# Altium schematic symbol library AD_Lib.SchLib: 1239 symbols (part 9 of 9)
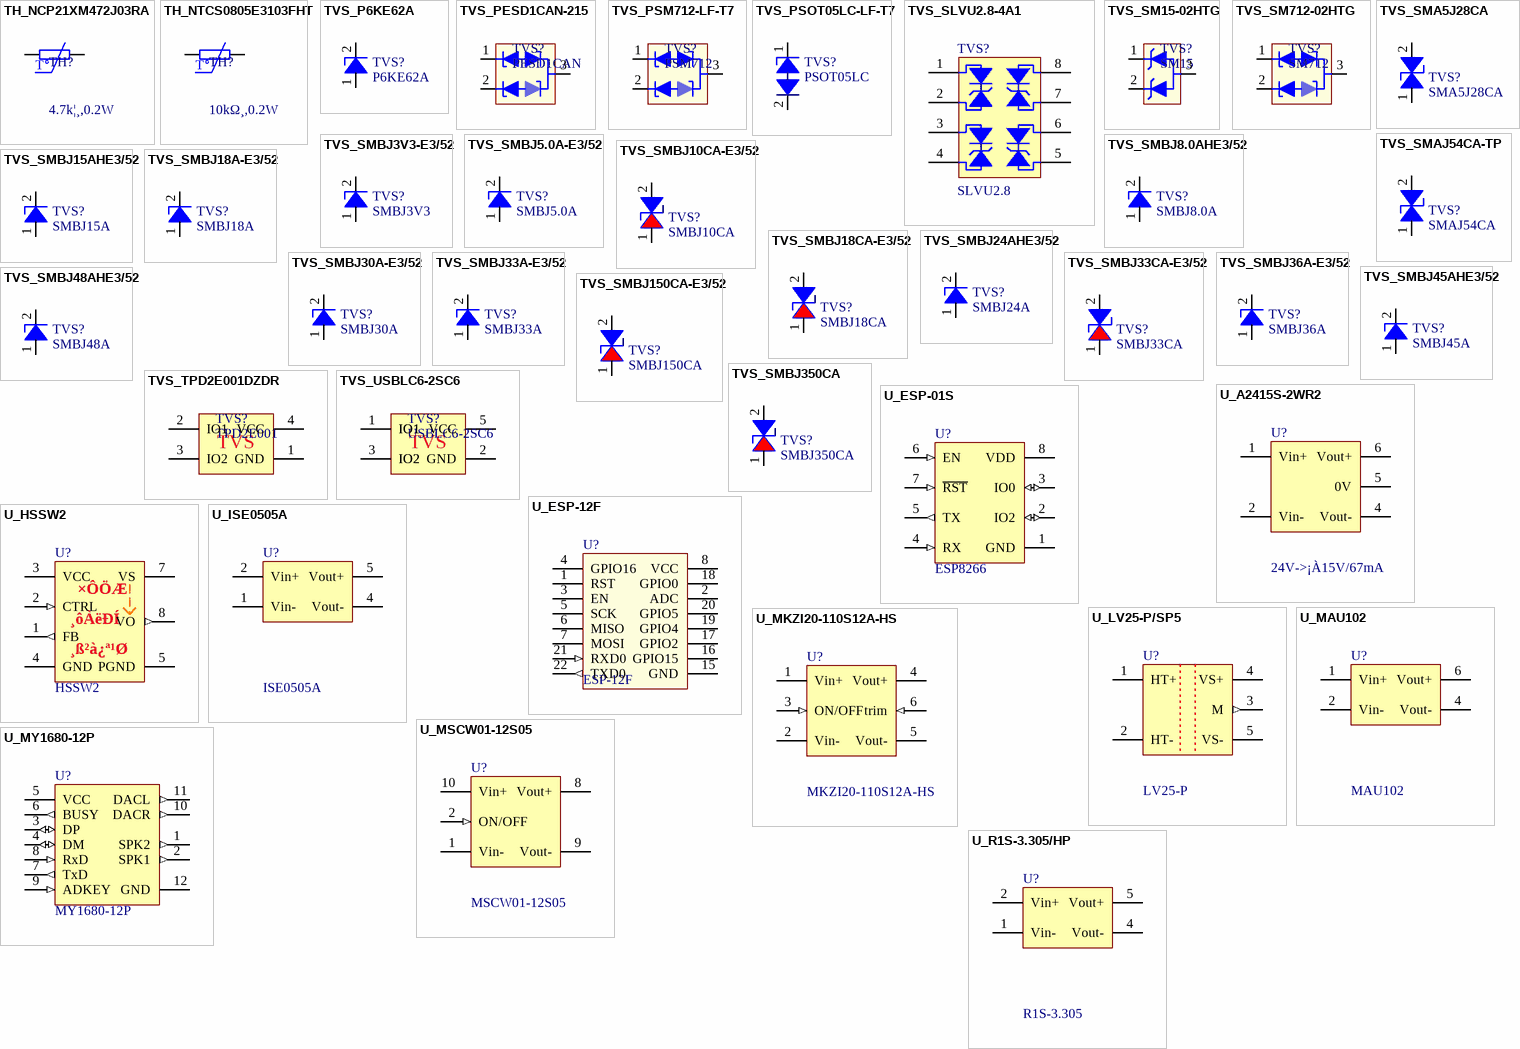
[diagram p50: symbols TH_NCP21XM472J03RA to U_R1S-3.305/HP]

## U_HSSW2
designator U?, comment HSSW2
×ÔÖÆ; ¸ß²à¿ª¹Ø; ¸ôÀë&·´À¡; Manufacturer: GRC; Quality: -40~66¡æ; Value: 300V/2A; pro-environment: RoHS; other: Vin=40~160V;Vout=12V/1.67A;20W;´øÉ¢ÈÈÆ¬; PadsNum: 9; SN: SN; Category: Ä£¿éµçÂ·; OPN: HSSW2; Part: HSSW2; QTY: -; Price: ?; OPN_JLC: GRC; SN_JLC: SN_JLC; Price_JLC: 0
footprint U_HSSW2 (×ÔÖÆ¼þ£¬¸ß²à¿ª¹Ø£¬¸ôÀë+·´À¡)
pins: 1 FB (out), 2 CTRL (in), 3 VCC (power), 4 GND (power), 5 PGND (power), 7 VS (power), 8 VO (out), 11 RV- (power), 12 RV+
text: ×ÔÖÆ; ¸ôÀëÐÍ; ¸ß²à¿ª¹Ø

## U_ISE0505A
designator U?, comment ISE0505A
DC/DC,Vin=5V;Vout=5V/0.2A; Manufacturer: XP; Quality: -40~105°C; pro-environment: RoHS; PadsNum: 0; Value: 5V/0.2A; SN: SN; other: Vin=5V;Vout=5V/0.2A; Category: Isolated DC/DC Converters; OPN: ISE0505A; Part: ISE0505A; QTY: 40; Price: ?; Price_JLC: 0
footprint U_XP_ISE0505A (DC/DC XP)
pins: 1 Vin- (power), 2 Vin+ (power), 4 Vout- (power), 5 Vout+ (power)

## U_LV25-P/SP5
designator U?, comment LV25-P
Voltage Sensor;Vin=500V;Iin=10mA;Gain=2.5; Manufacturer: LEM; Quality: -40~85¡æ; Value: G=2500:1000; pro-environment: RoHS; OPN: LV25-P/SP5; PadsNum: 0; SN: SN; other: Vin=500V;Iin=10mA;Gain=2.5; Category: Ä£¿éµçÂ·; Part: LV25-P; QTY: 1; Price: ?; OPN_JLC: OPN_JLC; SN_JLC: SN_JLC; Price_JLC: 0
footprint LV25-P (Footprint not found)
pins: 1 HT+ (power), 2 HT- (power), 3 M (out), 4 VS+ (power), 5 VS- (power)

## U_MAU102
designator U?, comment MAU102
DC/DC,Vin=5V;Vout=5V/0.2A; Manufacturer: MINMAX; Quality: -40~100¡æ; pro-environment: RoHS; PadsNum: 0; Value: 5V/0.2A; SN: SN; other: Vin=5V;Vout=5V/0.2A; Category: Ä£¿éµçÂ·; OPN: MAU102; Part: MAU102; QTY: 10; Price: 35.5329; OPN_JLC: OPN_JLC; SN_JLC: SN_JLC; Price_JLC: 0
footprint TRACO_SIP6 (Footprint not found)
pins: 1 Vin+ (power), 2 Vin- (power), 4 Vout- (power), 6 Vout+ (power)

## U_MKZI20-110S12A-HS
designator U?, comment MKZI20-110S12A-HS
DC/DC,Vin=40~160V;Vout=12V/1.67A; Manufacturer: MINMAX; Quality: -40~66¡æ; pro-environment: RoHS; SN: 03.4.11.11.99201201S; other: Vin=40~160V;Vout=12V/1.67A;20W;´øÉ¢ÈÈÆ¬; PadsNum: 0; Value: 12V/1.67A; Category: Ä£¿éµçÂ·; OPN: MKZI20-110S12A-HS; Part: MKZI20-110S12A-HS; QTY: -; Price: ?; OPN_JLC: OPN_JLC; SN_JLC: SN_JLC; Price_JLC: 0
footprint MKZI20A (MINMAX¸ôÀëµçÔ´£¬20W£¬´ø"A"ºó×º)
pins: 1 Vin+ (power), 2 Vin- (power), 3 ON/OFF (in), 4 Vout+ (power), 5 Vout- (power), 6 trim (in)

## U_MSCW01-12S05
designator U?, comment MSCW01-12S05
DC/DC,Vin=12V£¬Vout=5V/0.2A, ÎÈÑ¹; Manufacturer: MINMAX; Quality: -40~85¡æ; pro-environment: RoHS; other: Vin=9~18V;Vout=5V/0.2A; PadsNum: 0; Value: 5V/0.2A; SN: SN; Category: Ä£¿éµçÂ·; OPN: MSCW01-12S05; Part: MSCW01-12S05; QTY: 39; Price: ?; OPN_JLC: OPN_JLC; SN_JLC: SN_JLC; Price_JLC: 0
footprint MINMAX_MSCW01 (DC/DC¸ôÀëµçÔ´Ä£¿é£»MSCW01Ö®1WÏµÁÐ£»MINMAX)
pins: 1 Vin- (power), 2 ON/OFF (in), 8 Vout+ (power), 9 Vout- (power), 10 Vin+ (power)

## U_MY1680-12P
designator U?, comment MY1680-12P
Voice;UART;3W; Manufacturer: ÉîÛÚÂõÓÅ; Quality: -40~85¡æ; Value: UART<->Voice; pro-environment: RoHS; other: 3W Speaker; 16M Flash; PadsNum: 0; SN: SN; Category: Ä£¿éµçÂ·; OPN: MY1680-12P; Part: MY1680-12P; QTY: 1; Price: 11.5; OPN_JLC: OPN_JLC; SN_JLC: SN_JLC; Price_JLC: 0
footprint MY1680-12P (ÉîÛÚÂõÓÅÓïÒôÄ£¿é)
pins: 1 SPK2 (out), 2 SPK1 (out), 3 DP (io), 4 DM (io), 5 VCC (power), 6 BUSY (out), 7 TxD (out), 8 RxD (in), 9 ADKEY (in), 10 DACR (out), 11 DACL (out), 12 GND (power)

## U_R1S-3.305/HP
designator U?, comment R1S-3.305
DC/DC,Vin=3.3V;Vout=5V/0.2A; Manufacturer: RECOM; Quality: -40~100¡æ; pro-environment: RoHS; SN: 03.4.11.11.85330501S; OPN: R1S-3.305/HP; PadsNum: 0; Value: 5V/0.2A; other: Vin=3.3V;Vout=5V/0.2A; Category: Ä£¿éµçÂ·; Part: R1S-3.305; QTY: 40; Price: ?; OPN_JLC: OPN_JLC; SN_JLC: SN_JLC; Price_JLC: 0
footprint U_RECOM_R1S5P (DC/DC¸ôÀëµçÔ´Ä£¿é£»R1S/R1DÖ®5pin ÏµÁÐ£»RECOM)
pins: 1 Vin- (power), 2 Vin+ (power), 4 Vout- (power), 5 Vout+ (power)

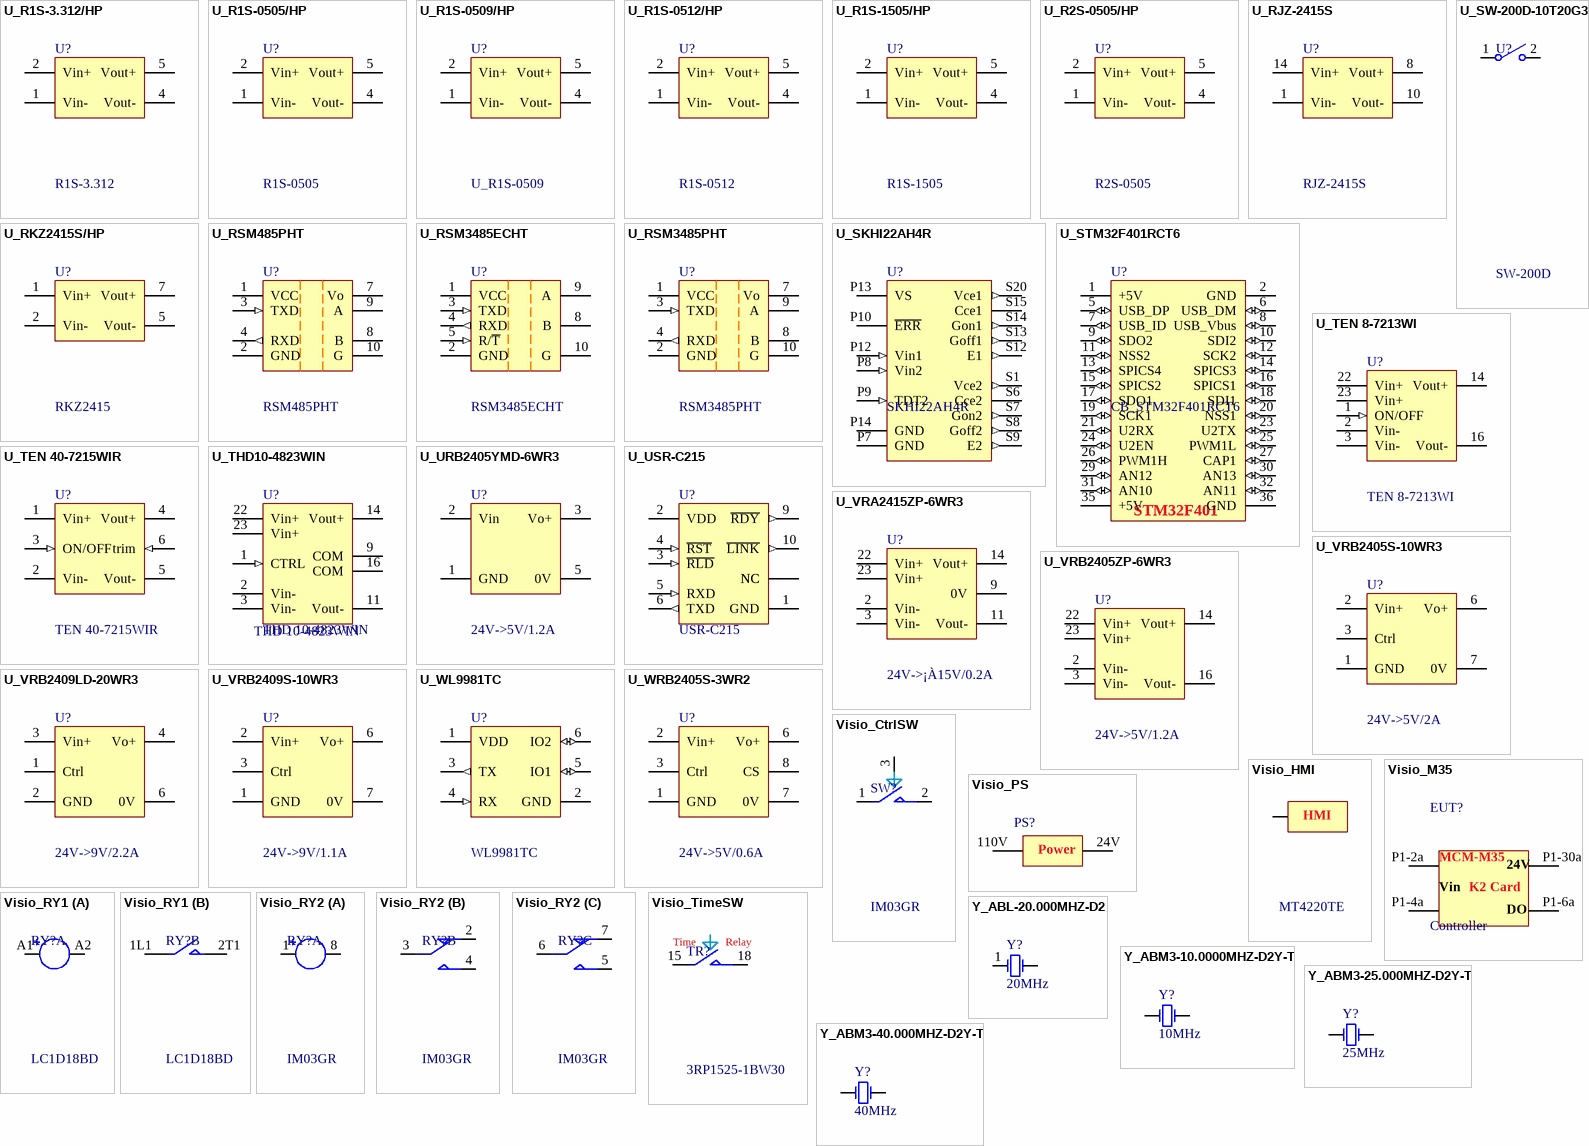
[diagram p40: symbols U_R1S-3.312/HP to Y_ABM3-40.000MHZ-D2Y-T]

## U_R1S-3.312/HP
designator U?, comment R1S-3.312
DC/DC,Vin=3.3V;Vout=12V/0.2A; Manufacturer: RECOM; Quality: -40~100¡æ; Value: 12V/84mA; pro-environment: RoHS; other: Vin=3.3V;Vout=12V/84mA; OPN: R1S-3.312/HP; PadsNum: 0; SN: SN; Category: Ä£¿éµçÂ·; Part: R1S-3.312; QTY: 40; Price: ?; OPN_JLC: OPN_JLC; SN_JLC: SN_JLC; Price_JLC: 0
footprint U_RECOM_R1S5P (DC/DC¸ôÀëµçÔ´Ä£¿é£»R1S/R1DÖ®5pin ÏµÁÐ£»RECOM)
pins: 1 Vin- (power), 2 Vin+ (power), 4 Vout- (power), 5 Vout+ (power)

## U_R1S-0505/HP
designator U?, comment R1S-0505
DC/DC,Vin=5V;Vout=5V/0.2A; Manufacturer: RECOM; Quality: -40~100¡æ; pro-environment: RoHS; OPN: R1S-0505/HP; PadsNum: 0; Value: 5V/0.2A; SN: SN; other: Vin=5V;Vout=5V/0.2A; Category: Ä£¿éµçÂ·; Part: R1S-0505; QTY: 40; Price: ?; OPN_JLC: OPN_JLC; SN_JLC: SN_JLC; Price_JLC: 0
footprint U_RECOM_R1S5P (DC/DC¸ôÀëµçÔ´Ä£¿é£»R1S/R1DÖ®5pin ÏµÁÐ£»RECOM)
pins: 1 Vin- (power), 2 Vin+ (power), 4 Vout- (power), 5 Vout+ (power)

## U_R1S-0509/HP
designator U?, comment U_R1S-0509
DC/DC,Vin=5V;Vout=9V/0.11A; Manufacturer: RECOM; Quality: -40~100¡æ; pro-environment: RoHS; SN: 03.4.11.13.99050901S; OPN: R1S-0509/HP; PadsNum: 0; Value: 9V/0.11A; other: Vin=5V;Vout=9V/0.11A; Category: Ä£¿éµçÂ·; Part: U_R1S-0509; QTY: 40; Price: ?; OPN_JLC: OPN_JLC; SN_JLC: SN_JLC; Price_JLC: 0
footprint U_RECOM_R1S5P (DC/DC¸ôÀëµçÔ´Ä£¿é£»R1S/R1DÖ®5pin ÏµÁÐ£»RECOM)
pins: 1 Vin- (power), 2 Vin+ (power), 4 Vout- (power), 5 Vout+ (power)

## U_R1S-0512/HP
designator U?, comment R1S-0512
DC/DC,Vin=5V;Vout=12V/0.2A; Manufacturer: RECOM; Quality: -40~100¡æ; Value: 12V/84mA; pro-environment: RoHS; SN: 03.4.11.11.85051201S; other: Vin=5V;Vout=12V/84mA; OPN: R1S-0512/HP; PadsNum: 0; Category: Ä£¿éµçÂ·; Part: R1S-0512; QTY: 40; Price: ?; OPN_JLC: OPN_JLC; SN_JLC: SN_JLC; Price_JLC: 0
footprint U_RECOM_R1S5P (DC/DC¸ôÀëµçÔ´Ä£¿é£»R1S/R1DÖ®5pin ÏµÁÐ£»RECOM)
pins: 1 Vin- (power), 2 Vin+ (power), 4 Vout- (power), 5 Vout+ (power)

## U_R1S-1505/HP
designator U?, comment R1S-1505
DC/DC,Vin=15V;Vout=5V/0.2A; Manufacturer: RECOM; Quality: -40~100¡æ; pro-environment: RoHS; SN: 03.4.11.11.85150501S; OPN: R1S-1505/HP; PadsNum: 0; Value: 5V/0.2A; other: Vin=15V;Vout=5V/0.2A; Category: Ä£¿éµçÂ·; Part: R1S-1505; QTY: 40; Price: 58.2309; OPN_JLC: OPN_JLC; SN_JLC: SN_JLC; Price_JLC: 0
footprint U_RECOM_R1S5P (DC/DC¸ôÀëµçÔ´Ä£¿é£»R1S/R1DÖ®5pin ÏµÁÐ£»RECOM)
pins: 1 Vin- (power), 2 Vin+ (power), 4 Vout- (power), 5 Vout+ (power)

## U_R2S-0505/HP
designator U?, comment R2S-0505
DC/DC,Vin=5V;Vout=5V/0.4A; Manufacturer: RECOM; Quality: -40~100¡æ; pro-environment: RoHS; SN: 03.4.11.13.99050502S; OPN: R2S-0505/HP; PadsNum: 0; Value: 5V/0.4A; other: Vin=5V;Vout=5V/0.4A; Category: Ä£¿éµçÂ·; Part: R2S-0505; QTY: 39; Price: 87.633; OPN_JLC: OPN_JLC; SN_JLC: SN_JLC; Price_JLC: 0
footprint U_RECOM_R2S5P (RECOMÖ®R2SÏµÁÐDC/DC£¬5Pin)
pins: 1 Vin- (power), 2 Vin+ (power), 4 Vout- (power), 5 Vout+ (power)

## U_RJZ-2415S
designator U?, comment RJZ-2415S
DC/DC,Vin=24V;Vout=15V/0.133A; Manufacturer: RECOM; Quality: -40~100¡æ; pro-environment: RoHS; SN: 03.4.11.11.11241501S; PadsNum: 0; Value: 15V/0.133A; other: Vin=24V;Vout=15V/0.133A; Category: Ä£¿éµçÂ·; OPN: RJZ-2415S; Part: RJZ-2415S; QTY: 24; Price: 73.5696; OPN_JLC: OPN_JLC; SN_JLC: SN_JLC; Price_JLC: 0
footprint U_RECOM_RJZ (RECOMÖ®DC/DCÄ£¿é)
pins: 1 Vin- (power), 8 Vout+ (power), 10 Vout- (power), 14 Vin+ (power)

## U_RKZ2415S/HP
designator U?, comment RKZ2415
DC/DC,Vin=24V;Vout=15V/132mA; Manufacturer: RECOM; Quality: -40~85¡æ; pro-environment: RoHS; OPN: RKZ2415S/HP; PadsNum: 0; Value: 15V/132mA; SN: SN; other: Vin=24V;Vout=15V/132mA; Category: Ä£¿éµçÂ·; Part: RKZ2415; QTY: 25; Price: 77.8518; OPN_JLC: OPN_JLC; SN_JLC: SN_JLC; Price_JLC: 0
footprint U_RECOM_RKZ (RECOMÖ®RKZÏµÁÐDC/DC)
pins: 1 Vin+ (power), 2 Vin- (power), 5 Vout- (power), 7 Vout+ (power)

## U_RSM485PHT
designator U?, comment RSM485PHT
RS485; 4.75~5.25V; 500kbps; ×Ô¶¯ÊÕ·¢; Manufacturer: ZLG; Quality: -40~85¡æ; Value: 5V,500kps; pro-environment: RoHS; other: 4.75~5.25V,500kbps; OPN: RSM3485PHT; PadsNum: 0; SN: SN; Category: Ä£¿éµçÂ·; Part: RSM485PHT; QTY: 30; Price: -; OPN_JLC: RSM3485PHT; SN_JLC: C882108; Price_JLC: 17.26
footprint U_RSM485 (ZLGÖ®¸ôÀëRS485ÊÕ·¢Æ÷£¬RSM(3)485E(PC)HT)
pins: 1 VCC (power), 2 GND (power), 3 TXD (in), 4 RXD (out), 7 Vo (power), 8 B, 9 A, 10 G (power)

## U_RSM3485ECHT
designator U?, comment RSM3485ECHT
RS485; 3.17~3.45V; 500kbps; Manufacturer: ZLG; Quality: -40~85¡æ; Value: 3.3V,500kps; pro-environment: RoHS; other: 3.17~3.45V,500kbps; PadsNum: 0; SN: SN; Category: Ä£¿éµçÂ·; OPN: RSM3485ECHT; Part: RSM3485ECHT; QTY: 15; Price: -; OPN_JLC: RSM3485ECHT; SN_JLC: C52032; Price_JLC: 43.98
footprint U_RSM485 (ZLGÖ®¸ôÀëRS485ÊÕ·¢Æ÷£¬RSM(3)485E(PC)HT)
pins: 1 VCC (power), 2 GND (power), 3 TXD (in), 4 RXD (out), 5 R/~{T} (in), 8 B, 9 A, 10 G (power)

## U_RSM3485PHT
designator U?, comment RSM3485PHT
RS485; 3.17~3.45V; 500kbps; ×Ô¶¯ÊÕ·¢; Manufacturer: ZLG; Quality: -40~85¡æ; Value: 3.3V,500kps; pro-environment: RoHS; other: 3.17~3.45V,500kbps; PadsNum: 0; SN: SN; Category: Ä£¿éµçÂ·; OPN: RSM3485PHT; Part: RSM3485PHT; QTY: 30; Price: -; OPN_JLC: RSM3485PHT; SN_JLC: C882109; Price_JLC: 17.26
footprint U_RSM485 (ZLGÖ®¸ôÀëRS485ÊÕ·¢Æ÷£¬RSM(3)485E(PC)HT)
pins: 1 VCC (power), 2 GND (power), 3 TXD (in), 4 RXD (out), 7 Vo (power), 8 B, 9 A, 10 G (power)

## U_SKHI22AH4R
designator U?, comment SKHI22AH4R
IGBTÇý¶¯; Vin=15V; 1200V/8MHz; °ëÇÅ; Manufacturer: SEMIKRON; Quality: -40~85¡æ; pro-environment: RoHS; other: Vin=15V;Vout=1200V; °ëÇÅ; PadsNum: 0; Value: 1200V/8MHz; SN: SN; Category: Ä£¿éµçÂ·; OPN: SKHI22AH4R; Part: SKHI22AH4R; QTY: 10; Price: 1000; OPN_JLC: OPN_JLC; SN_JLC: SN_JLC; Price_JLC: 0
footprint U_SKHI22A (Footprint not found)
pins: P7 GND (power), P8 Vin2 (in), P9 TDT2 (in), P10 ~{ERR} (oc), P12 Vin1 (in), P13 VS (power), P14 GND (power), S1 Vce2 (out), S6 Cce2, S7 Gon2 (out), S8 Goff2 (out), S9 E2 (out), S12 E1 (out), S13 Goff1 (out), S14 Gon1 (out), S15 Cce1, S20 Vce1 (out)

## U_STM32F401RCT6
designator U?, comment CB_STM32F401RCT6
CoreBoard; STM32F401RCT6;; Manufacturer: GRC; Quality: -40~85¡æ; pro-environment: RoHS; PadsNum: 0; Value: STM32F401RCT6; SN: SN; other: CoreBoard; STM32F401RCT6;; Category: Ä£¿éµçÂ·; OPN: CB_STM32F401RCT6; Part: CB_STM32F401RCT6; QTY: 1; Price: 0; OPN_JLC: CB_STM32F401RCT6; SN_JLC: SN_JLC; Price_JLC: 0
footprint J_HDR2*18 (Connector; Header; 2*18)
pins: 1 +5V (power), 2 GND (power), 5 USB_DP (io), 6 USB_DM (io), 7 USB_ID (io), 8 USB_Vbus (io), 9 SDO2 (io), 10 SDI2 (io), 11 NSS2 (io), 12 SCK2 (io), 13 SPICS4 (io), 14 SPICS3 (io), 15 SPICS2 (io), 16 SPICS1 (io), 17 SDO1 (io), 18 SDI1 (io), 19 SCK1 (io), 20 NSS1 (io), 21 U2RX (io), 23 U2TX (io), 24 U2EN (io), 25 PWM1L (io), 26 PWM1H (io), 27 CAP1 (io), 29 AN12 (io), 30 AN13 (io), 31 AN10 (io), 32 AN11 (io), 35 +5V (power), 36 GND (power)
text: STM32F401

## U_SW-200D-10T20G3
designator U?, comment SW-200D
´«¸ÐÆ÷; 12V/20mA; 2ms; Õð¶¯; Manufacturer: XKB; pro-environment: RoHS; Quality: -40~85¡æ; Value: 12V, 20mA; OPN: SW-200D-10T20G3; other: 12V; 20mA; PadsNum: 0; SN: SN; Category: ¼¯³ÉÐ¾Æ¬; Part: SW-200D; QTY: 3000; Price: ?; OPN_JLC: SW-200D-10T20G3; SN_JLC: C2914015; Price_JLC: 0.7781
footprint U_SW200D (Footprint not found)
pins: 1, 2

## U_TEN 8-7213WI
designator U?, comment TEN 8-7213WI
DC/DC,Vin=45V~160V;Vout=15V/0.5A; Manufacturer: TRACO; Quality: -40~85¡æ; pro-environment: RoHS; SN: 03.4.11.13.13721301S; PadsNum: 0; Value: 15V/0.5A; other: Vin=45V~160V;Vout=15V/0.5A; Category: Ä£¿éµçÂ·; OPN: TEN 8-7213WI; Part: TEN 8-7213WI; QTY: 1; Price: ?; OPN_JLC: OPN_JLC; SN_JLC: SN_JLC; Price_JLC: 0
footprint U_TEN 8WI (DC/DC£¬TEN 8WIÏµÁÐ£»TRACO)
pins: 1 ON/OFF (in), 2 Vin- (power), 3 Vin- (power), 14 Vout+ (power), 16 Vout- (power), 22 Vin+ (power), 23 Vin+ (power)

## U_TEN 40-7215WIR
designator U?, comment TEN 40-7215WIR
DC/DC,Vin=45V~160V;Vout=24V/1.6A; Manufacturer: TRACO; Quality: -40~85¡æ; pro-environment: RoHS; SN: 03.4.11.13.99721501S; PadsNum: 0; Value: 24V/1.6A; other: Vin=45V~160V;Vout=24V/1.6A; Category: Ä£¿éµçÂ·; OPN: TEN 40-7215WIR; Part: TEN 40-7215WIR; QTY: 1; Price: ?; OPN_JLC: OPN_JLC; SN_JLC: SN_JLC; Price_JLC: 0
footprint U_TEN 40WIR (TRACOµçÔ´Ä£¿é£¬110V-->24V)
pins: 1 Vin+ (power), 2 Vin- (power), 3 ON/OFF (in), 4 Vout+ (power), 5 Vout- (power), 6 trim (in)

## U_THD10-4823WIN
designator U?, comment THD 10-4823WIN
DC/DC,Vin=18~75V;Vout=+15V/-15; Iout = 333mA both outpus; Manufacturer: TRACO Power; Quality: -40 ~ 85°C; Value: 15V/333mA : -15V/333mA; pro-environment: RoHS; PadsNum: 0; Category: Isolated DC/DC Converters; OPN: THD 10-4823WIN; QTY: -; Price: ?; OPN_JLC: OPN_JLC; Price_JLC: 0; Part: THD 10-4823WIN
pins: 1 CTRL (in), 2 Vin- (power), 3 Vin- (power), 9 COM (power), 11 Vout- (power), 14 Vout+ (power), 16 COM (power), 22 Vin+ (power), 23 Vin+

## U_URB2405YMD-6WR3
designator U?, comment 24V->5V/1.2A
DC/DC; Vin=9V~36V; Vout=5V/1.2A; Manufacturer: MORNSUN; Quality: -40~85¡æ; pro-environment: RoHS; OPN: URB2405YMD-6WR3; PadsNum: 0; Value: 5V/1.2A; SN: SN; other: Vin=9V~36V;Vout=5V/1.2A; Category: Ä£¿éµçÂ·; Part: 24V->5V/1.2A; QTY: 19; Price: ?; OPN_JLC: URB2405YMD-6WR3; SN_JLC: C97305; Price_JLC: 42.6
footprint U_URB_YMD-6WR3 (Footprint not found)
pins: 1 GND (power), 2 Vin (power), 3 Vo+ (power), 5 0V (power)

## U_USR-C215
designator U?, comment USR-C215
WiFi; UART;; Manufacturer: É½¶«ÓÐÈË; Quality: -40~85¡æ; Value: UART<->WiFi; pro-environment: RoHS; PadsNum: 0; SN: SN; other: UART<->WiFi; Category: Ä£¿éµçÂ·; OPN: USR-C215; Part: USR-C215; QTY: 5; Price: 30.01; OPN_JLC: USR-C215; SN_JLC: C250565; Price_JLC: 30.01
footprint U_USR-C215 (É½¶«ÓÐÈË´®¿Ú×ªWiFiÄ£¿é)
pins: 1 GND (power), 2 VDD (power), 3 ~{RLD} (in), 4 ~{RST} (in), 5 RXD (in), 6 TXD (out), 7 NC, 8 NC, 9 ~{RDY} (out), 10 ~{LINK} (out)

## U_VRA2415ZP-6WR3
designator U?, comment 24V->¡À15V/0.2A
DC/DC,Vin=18V~36V;Vout=¡À15V/0.2A; Manufacturer: MORNSUN; Quality: -40~85¡æ; pro-environment: RoHS; OPN: VRA2415ZP-6WR3; PadsNum: 0; Value: ¡À15V/0.2A; SN: SN; other: Vin=18V~36V;Vout=¡À15V/0.2A; Category: Ä£¿éµçÂ·; Part: 24V->¡À15V/0.2A; QTY: 1; Price: ?; OPN_JLC: OPN_JLC; SN_JLC: SN_JLC; Price_JLC: 0
footprint U_VRB_ZP-6WR3 (DC/DC£¬VRB_ZP-6WR3ÏµÁÐ£»MORNSUN)
pins: 2 Vin- (power), 3 Vin- (power), 9 0V (power), 11 Vout- (power), 14 Vout+ (power), 16 0V (power), 22 Vin+ (power), 23 Vin+ (power)

## U_VRB2405S-10WR3
designator U?, comment 24V->5V/2A
DC/DC; Vin=18V~36V; Vout=5V/2A; Manufacturer: MORNSUN; Quality: -40~85¡æ; Value: 5V/2A; pro-environment: RoHS; other: Vin=18V~36V;Vout=9V/1.1A; OPN: VRB2405S-10WR3; PadsNum: 0; SN: SN; Category: Ä£¿éµçÂ·; Part: 24V->5V/2A; QTY: 1; Price: ?; OPN_JLC: OPN_JLC; SN_JLC: SN_JLC; Price_JLC: 0
footprint U_VRB_S-10WR3 (DC/DC£¬VMORNSUNÖ®RB_S-10WR3ÏµÁÐ£»)
pins: 1 GND (power), 2 Vin+ (power), 3 Ctrl (power), 6 Vo+ (power), 7 0V (power)

## U_VRB2405ZP-6WR3
designator U?, comment 24V->5V/1.2A
DC/DC,Vin=18V~36V;Vout=5V/1.2A; Manufacturer: MORNSUN; Quality: -40~85¡æ; pro-environment: RoHS; OPN: VRB2405ZP-6WR3; PadsNum: 0; Value: 5V/1.2A; SN: SN; other: Vin=18V~36V;Vout=5V/1.2A; Category: Ä£¿éµçÂ·; Part: 24V->5V/1.2A; QTY: 1; Price: ?; OPN_JLC: OPN_JLC; SN_JLC: SN_JLC; Price_JLC: 0
footprint U_VRB_ZP-6WR3 (DC/DC£¬VRB_ZP-6WR3ÏµÁÐ£»MORNSUN)
pins: 2 Vin- (power), 3 Vin- (power), 14 Vout+ (power), 16 Vout- (power), 22 Vin+ (power), 23 Vin+ (power)

## U_VRB2409LD-20WR3
designator U?, comment 24V->9V/2.2A
DC/DC; Vin=18V~36V; Vout=9V/2.2A; Manufacturer: MORNSUN; Quality: -40~85¡æ; pro-environment: RoHS; other: Vin=18V~36V;Vout=5V/1.2A; OPN: VRB2409LD-20WR3; PadsNum: 0; Value: 9V/2.2A; SN: SN; Category: Ä£¿éµçÂ·; Part: 24V->9V/2.2A; QTY: 1; Price: ?; OPN_JLC: OPN_JLC; SN_JLC: SN_JLC; Price_JLC: 0
footprint U_VRB_LD-20WR3 (½ðÉýÑôVRB_LD-20WR3ÏµÁÐ)
pins: 1 Ctrl (power), 2 GND (power), 3 Vin+ (power), 4 Vo+ (power), 6 0V (power)

## U_VRB2409S-10WR3
designator U?, comment 24V->9V/1.1A
DC/DC; Vin=18V~36V; Vout=9V/1.1A; Manufacturer: MORNSUN; Quality: -40~85¡æ; pro-environment: RoHS; OPN: VRB2409S-10WR3; PadsNum: 0; Value: 9V/1.1A; SN: SN; other: Vin=18V~36V;Vout=9V/1.1A; Category: Ä£¿éµçÂ·; Part: 24V->9V/1.1A; QTY: 1; Price: ?; OPN_JLC: OPN_JLC; SN_JLC: SN_JLC; Price_JLC: 0
footprint U_VRB_S-10WR3 (DC/DC£¬VMORNSUNÖ®RB_S-10WR3ÏµÁÐ£»)
pins: 1 GND (power), 2 Vin+ (power), 3 Ctrl (power), 6 Vo+ (power), 7 0V (power)

## U_WL9981TC
designator U?, comment WL9981TC
UART<->BLE; 3.3V; 20.5*13; 115200bps;; Manufacturer: Æß°¬; Quality: -20~85¡æ; pro-environment: RoHS; other: Vin=2.2~3.6V; BR=115200; PadsNum: 6; Value: UART<->BLE; SN: SN; Category: Ä£¿éµçÂ·; OPN: WL9981TC; Part: WL9981TC; QTY: 1; Price: 7.35; OPN_JLC: WL9981TC; SN_JLC: C2689544; Price_JLC: 7.35
footprint U_WL9981TC (Footprint not found)
pins: 1 VDD (power), 2 GND (power), 3 TX (out), 4 RX (in), 5 IO1 (io), 6 IO2 (io)

## U_WRB2405S-3WR2
designator U?, comment 24V->5V/0.6A
DC/DC; Vin=18V~36V; Vout=5V/0.6A; Manufacturer: MORNSUN; Quality: -40~85¡æ; pro-environment: RoHS; OPN: WRB2405S-3WR2; PadsNum: 0; Value: 5V/0.6A; SN: SN; other: Vin=18V~36V;Vout=5V/0.6A; Category: Ä£¿éµçÂ·; Part: 24V->5V/0.6A; QTY: 1; Price: ?; OPN_JLC: WRB2405S-3WR2; SN_JLC: C59203; Price_JLC: 40.61
footprint U_WRB_S-3WR2 (Footprint not found)
pins: 1 GND (power), 2 Vin+ (power), 3 Ctrl (power), 6 Vo+ (power), 7 0V (power), 8 CS (power)

## Visio_CtrlSW
designator SW?, comment IM03GR
¼ÌµçÆ÷, 2NC2NO; Manufacturer: TE Connectivity; pro-environment: RoHS; Quality: -40~85¡æ; Vaule: 2A-30VDC, 5V; PadsNum: 0; SN: SN; OPN: IM03GR; Part: IM03GR; Category: ¼ÌµçÆ÷; QTY: 1000; Price: 15.8878; OPN_JLC: OPN_JLC; SN_JLC: SN_JLC; Price_JLC: 0
footprint IM_G (Footprint not found)
pins: 1, 2, 3

## Visio_HMI
designator HMI?, comment MT4220TE
¼ÌµçÆ÷, 2NC2NO; Manufacturer: TE Connectivity; pro-environment: RoHS; Quality: -40~85¡æ; Vaule: 2A-30VDC, 5V; OPN: IM03GR; PadsNum: 0; SN: SN; Part: IM03GR; Category: ¼ÌµçÆ÷; QTY: 1000; Price: 15.8878; OPN_JLC: OPN_JLC; SN_JLC: SN_JLC; Price_JLC: 0
footprint IM_G (Footprint not found)
pins: 1
text: HMI

## Visio_M35
designator EUT?, comment Controller
¼ÌµçÆ÷, 2NC2NO; Manufacturer: TE Connectivity; pro-environment: RoHS; Quality: -40~85¡æ; Vaule: 2A-30VDC, 5V; OPN: IM03GR; PadsNum: 0; SN: SN; Part: IM03GR; Category: ¼ÌµçÆ÷; QTY: 1000; Price: 15.8878; OPN_JLC: OPN_JLC; SN_JLC: SN_JLC; Price_JLC: 0
footprint IM_G (Footprint not found)
pins: P1-2a, P1-4a, P1-6a, P1-30a
text: MCM-M35; 24V; Vin; K2 Card; DO
